# Altium footprint library Wurth_Elektronik_Electromechanic_Wire_to_Board_Connectors_rev16a.PCBLIB: 662 footprints (part 5 of 42)
Each footprint in its own frame and in the unit in brackets; x right, y up, seen from the top. Pads: shape width x height; smd on the part's side, far side on the other; paste and mask are expansions set on the pad; w line width, h text height; cw(c..) or ccw(c..) is an arc to the next point about the centre after c.
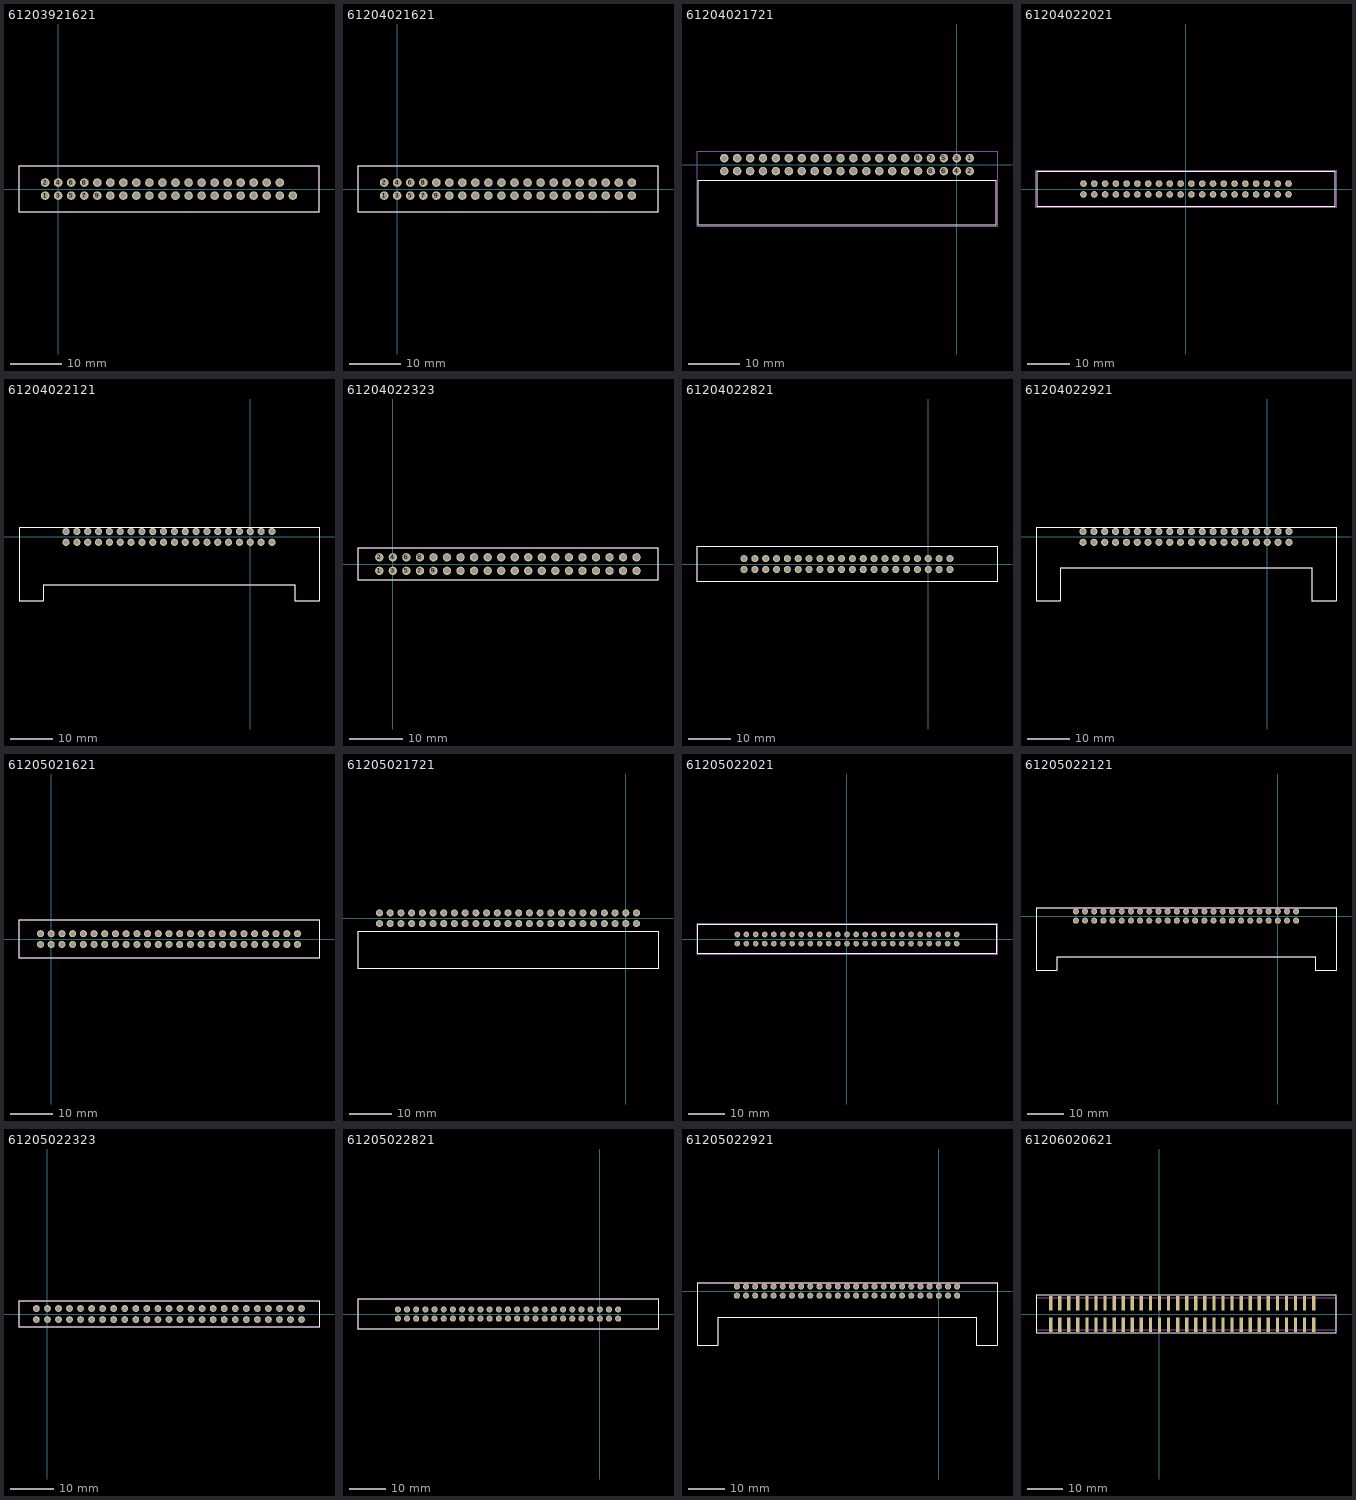
[diagram p4: the footprints below, top view; thin cyan lines are the x and y axes]

## 61203921621 [mil]
pads (39):
  round 66 hole 44: 1(-100,-50) 2(-100,50) 3(0,-50) 4(0,50) 5(100,-50) 6(100,50) 7(200,-50) 8(200,50) 9(300,-50) 10(300,50) 11(400,-50) 12(400,50) 13(500,-50) 14(500,50) 15(600,-50) 16(600,50) 17(700,-50) 18(700,50) 19(800,-50) 20(800,50) 21(900,-50) 22(900,50) 23(1000,-50) 24(1000,50) 25(1100,-50) 26(1100,50) 27(1200,-50) 28(1200,50) 29(1300,-50) 30(1300,50) 31(1400,-50) 32(1400,50) 33(1500,-50) 34(1500,50) 35(1600,-50) 36(1600,50) 37(1700,-50) 38(1700,50) 39(1800,-50)
Top Overlay:
  lines w5: -300.79,-179.13 2001,-179.13 2001,180 -300.79,180 -300.79,-179.13
Mechanical 2:
  text ">NAME" at 825,200 h77.5
Mechanical 4:
  text ">VALUE" at 800,-250 h77.5
Mechanical 16:
  lines w5: -300.79,-179.13 2001,-179.13 2001,180 -300.79,180 -300.79,-179.13
  text "1" at -125,-75 h77.5
  text "39" at 1757,-78.94 h77.5

## 61204021621 [mil]
pads (40):
  round 66 hole 44: 1(-100,-50) 2(-100,50) 3(0,-50) 4(0,50) 5(100,-50) 6(100,50) 7(200,-50) 8(200,50) 9(300,-50) 10(300,50) 11(400,-50) 12(400,50) 13(500,-50) 14(500,50) 15(600,-50) 16(600,50) 17(700,-50) 18(700,50) 19(800,-50) 20(800,50) 21(900,-50) 22(900,50) 23(1000,-50) 24(1000,50) 25(1100,-50) 26(1100,50) 27(1200,-50) 28(1200,50) 29(1300,-50) 30(1300,50) 31(1400,-50) 32(1400,50) 33(1500,-50) 34(1500,50) 35(1600,-50) 36(1600,50) 37(1700,-50) 38(1700,50) 39(1800,-50) 40(1800,50)
Top Overlay:
  lines w5: -300.79,-179.13 2001,-179.13 2001,180 -300.79,180 -300.79,-179.13
Mechanical 2:
  text ">NAME" at 825,200 h77.5
Mechanical 4:
  text ">VALUE" at 800,-250 h77.5
Mechanical 16:
  lines w5: -300.79,-179.13 2001,-179.13 2001,180 -300.79,180 -300.79,-179.13
  text "1" at -125,-75 h77.5
  text "40" at 1757,22 h77.5

## 61204021721 [mil]
pads (40):
  round 66 hole 44: 1(100,50) 2(100,-50) 3(0,50) 4(0,-50) 5(-100,50) 6(-100,-50) 7(-200,50) 8(-200,-50) 9(-300,50) 10(-300,-50) 11(-400,50) 12(-400,-50) 13(-500,50) 14(-500,-50) 15(-600,50) 16(-600,-50) 17(-700,50) 18(-700,-50) 19(-800,50) 20(-800,-50) 21(-900,50) 22(-900,-50) 23(-1000,50) 24(-1000,-50) 25(-1100,50) 26(-1100,-50) 27(-1200,50) 28(-1200,-50) 29(-1300,50) 30(-1300,-50) 31(-1400,50) 32(-1400,-50) 33(-1500,50) 34(-1500,-50) 35(-1600,50) 36(-1600,-50) 37(-1700,50) 38(-1700,-50) 39(-1800,50) 40(-1800,-50)
Top Overlay:
  lines w5: -2000.79,-470.87 301,-470.87 301,-122.44 -2000.79,-122.44 -2000.79,-470.87
Mechanical 2:
  text ">NAME" at 357,-250.7 h77.5
Mechanical 4:
  text ">VALUE" at 357,-348.7 h77.5
Mechanical 16:
  text "1" at 75,25 h77.5
  text "40" at -1850,-75 h77.5
  text "2" at 75,-75 h77.5
Mechanical 27:
  lines w5: -2010.63,-480.71 311,-480.71 311,103 -2010.63,103 -2010.63,-480.71

## 61204022021 [mil]
pads (40):
  round 61.5 hole 41: 1(950,50) 2(950,-50) 3(850,50) 4(850,-50) 5(750,50) 6(750,-50) 7(650,50) 8(650,-50) 9(550,50) 10(550,-50) 11(450,50) 12(450,-50) 13(350,50) 14(350,-50) 15(250,50) 16(250,-50) 17(150,50) 18(150,-50) 19(50,50) 20(50,-50) 21(-50,50) 22(-50,-50) 23(-150,50) 24(-150,-50) 25(-250,50) 26(-250,-50) 27(-350,50) 28(-350,-50) 29(-450,50) 30(-450,-50) 31(-550,50) 32(-550,-50) 33(-650,50) 34(-650,-50) 35(-750,50) 36(-750,-50) 37(-850,50) 38(-850,-50) 39(-950,50) 40(-950,-50)
Top Overlay:
  lines w5: -1379.92,-163.39 1380,-163.39 1380,164 -1379.92,164 -1379.92,-163.39
Mechanical 2:
  text ">NAME" at 0,200 h77.5
Mechanical 4:
  text ">VALUE" at 0,-250 h77.5
Mechanical 16:
  text "1" at 925,25 h77.5
  text "40" at -1000,-75 h77.5
  text "2" at 925,-75 h77.5
Mechanical 27:
  lines w5: -1389.76,-173.23 1390,-173.23 1390,174 -1389.76,174 -1389.76,-173.23

## 61204022121 [mil]
pads (40):
  round 66 hole 44: 1(200,50) 2(200,-50) 3(100,50) 4(100,-50) 5(0,50) 6(0,-50) 7(-100,50) 8(-100,-50) 9(-200,50) 10(-200,-50) 11(-300,50) 12(-300,-50) 13(-400,50) 14(-400,-50) 15(-500,50) 16(-500,-50) 17(-600,50) 18(-600,-50) 19(-700,50) 20(-700,-50) 21(-800,50) 22(-800,-50) 23(-900,50) 24(-900,-50) 25(-1000,50) 26(-1000,-50) 27(-1100,50) 28(-1100,-50) 29(-1200,50) 30(-1200,-50) 31(-1300,50) 32(-1300,-50) 33(-1400,50) 34(-1400,-50) 35(-1500,50) 36(-1500,-50) 37(-1600,50) 38(-1600,-50) 39(-1700,50) 40(-1700,-50)
Top Overlay:
  lines w5: -2133.86,-590.55 -2133.86,90 634,90 634,-590.55 410,-590.55 410,-440.94 -1909.45,-440.94 -1909.45,-590.55 -2133.86,-590.55
Mechanical 2:
  text ">NAME" at -875,125 h77.5
Mechanical 4:
  text ">VALUE" at -886.81,-639.57 h77.5
Mechanical 16:
  lines w5: -2133.86,-590.55 -1909.45,-590.55 -1909.45,-440.94 410,-440.94 410,-590.55 634,-590.55 634,90 -2133.86,90 -2133.86,-590.55
  text "1" at 175,25 h77.5
  text "40" at -1750,-75 h77.5

## 61204022323 [mil]
pads (40):
  round 61.5 hole 41: 1(-100,-50) 2(-100,50) 3(0,-50) 4(0,50) 5(100,-50) 6(100,50) 7(200,-50) 8(200,50) 9(300,-50) 10(300,50) 11(400,-50) 12(400,50) 13(500,-50) 14(500,50) 15(600,-50) 16(600,50) 17(700,-50) 18(700,50) 19(800,-50) 20(800,50) 21(900,-50) 22(900,50) 23(1000,-50) 24(1000,50) 25(1100,-50) 26(1100,50) 27(1200,-50) 28(1200,50) 29(1300,-50) 30(1300,50) 31(1400,-50) 32(1400,50) 33(1500,-50) 34(1500,50) 35(1600,-50) 36(1600,50) 37(1700,-50) 38(1700,50) 39(1800,-50) 40(1800,50)
Top Overlay:
  lines w5: -257.28,-118.11 1958,-118.11 1958,119 -257.28,119 -257.28,-118.11
Mechanical 2:
  text ">NAME" at 775,150 h77.5
Mechanical 4:
  text ">VALUE" at 775,-200 h77.5
Mechanical 16:
  lines w5: -257.28,-118.11 1958,-118.11 1958,119 -257.28,119 -257.28,-118.11
  text "1" at -125,-75 h77.5
  text "40" at 1750,25 h77.5

## 61204022821 [mil]
pads (40):
  round 66 hole 44: 1(200,50) 2(200,-50) 3(100,50) 4(100,-50) 5(0,50) 6(0,-50) 7(-100,50) 8(-100,-50) 9(-200,50) 10(-200,-50) 11(-300,50) 12(-300,-50) 13(-400,50) 14(-400,-50) 15(-500,50) 16(-500,-50) 17(-600,50) 18(-600,-50) 19(-700,50) 20(-700,-50) 21(-800,50) 22(-800,-50) 23(-900,50) 24(-900,-50) 25(-1000,50) 26(-1000,-50) 27(-1100,50) 28(-1100,-50) 29(-1200,50) 30(-1200,-50) 31(-1300,50) 32(-1300,-50) 33(-1400,50) 34(-1400,-50) 35(-1500,50) 36(-1500,-50) 37(-1600,50) 38(-1600,-50) 39(-1700,50) 40(-1700,-50)
Top Overlay:
  lines w5: -2133.86,-163.39 634,-163.39 634,164 -2133.86,164 -2133.86,-163.39
Mechanical 2:
  text ">NAME" at -750,200 h77.5
Mechanical 4:
  text ">VALUE" at -750,-250 h77.5
Mechanical 16:
  lines w5: -2133.86,-163.39 634,-163.39 634,164 -2133.86,164 -2133.86,-163.39
  text "1" at 175,25 h77.5
  text "40" at -1750,-75 h77.5

## 61204022921 [mil]
pads (40):
  round 66 hole 44: 1(200,50) 2(200,-50) 3(100,50) 4(100,-50) 5(0,50) 6(0,-50) 7(-100,50) 8(-100,-50) 9(-200,50) 10(-200,-50) 11(-300,50) 12(-300,-50) 13(-400,50) 14(-400,-50) 15(-500,50) 16(-500,-50) 17(-600,50) 18(-600,-50) 19(-700,50) 20(-700,-50) 21(-800,50) 22(-800,-50) 23(-900,50) 24(-900,-50) 25(-1000,50) 26(-1000,-50) 27(-1100,50) 28(-1100,-50) 29(-1200,50) 30(-1200,-50) 31(-1300,50) 32(-1300,-50) 33(-1400,50) 34(-1400,-50) 35(-1500,50) 36(-1500,-50) 37(-1600,50) 38(-1600,-50) 39(-1700,50) 40(-1700,-50)
Top Overlay:
  lines w5: -2133.86,-590.16 -2133.86,90 634,90 634,-590.16 410,-590.16 410,-283.46 -1909.45,-283.46 -1909.45,-590.16 -2133.86,-590.16
Mechanical 2:
  text ">NAME" at -875,125 h77.5
Mechanical 4:
  text ">VALUE" at -886.81,-482.09 h77.5
Mechanical 16:
  lines w5: -2133.86,-590.16 -1909.45,-590.16 -1909.45,-283.46 410,-283.46 410,-590.16 634,-590.16 634,90 -2133.86,90 -2133.86,-590.16
  text "1" at 175,25 h77.5
  text "40" at -1750,-75 h77.5

## 61205021621 [mil]
pads (50):
  round 66 hole 44: 1(-100,-50) 2(-100,50) 3(0,-50) 4(0,50) 5(100,-50) 6(100,50) 7(200,-50) 8(200,50) 9(300,-50) 10(300,50) 11(400,-50) 12(400,50) 13(500,-50) 14(500,50) 15(600,-50) 16(600,50) 17(700,-50) 18(700,50) 19(800,-50) 20(800,50) 21(900,-50) 22(900,50) 23(1000,-50) 24(1000,50) 25(1100,-50) 26(1100,50) 27(1200,-50) 28(1200,50) 29(1300,-50) 30(1300,50) 31(1400,-50) 32(1400,50) 33(1500,-50) 34(1500,50) 35(1600,-50) 36(1600,50) 37(1700,-50) 38(1700,50) 39(1800,-50) 40(1800,50) 41(1900,-50) 42(1900,50) 43(2000,-50) 44(2000,50) 45(2100,-50) 46(2100,50) 47(2200,-50) 48(2200,50) 49(2300,-50) 50(2300,50)
Top Overlay:
  lines w5: -300.79,-179.13 2501,-179.13 2501,180 -300.79,180 -300.79,-179.13
Mechanical 2:
  text ">NAME" at 1025,200 h77.5
Mechanical 4:
  text ">VALUE" at 1000,-250 h77.5
Mechanical 16:
  lines w5: -300.79,-179.13 2501,-179.13 2501,180 -300.79,180 -300.79,-179.13
  text "1" at -125,-75 h77.5
  text "50" at 2257,22 h77.5

## 61205021721 [mil]
pads (50):
  round 66 hole 44: 1(100,50) 2(100,-50) 3(0,50) 4(0,-50) 5(-100,50) 6(-100,-50) 7(-200,50) 8(-200,-50) 9(-300,50) 10(-300,-50) 11(-400,50) 12(-400,-50) 13(-500,50) 14(-500,-50) 15(-600,50) 16(-600,-50) 17(-700,50) 18(-700,-50) 19(-800,50) 20(-800,-50) 21(-900,50) 22(-900,-50) 23(-1000,50) 24(-1000,-50) 25(-1100,50) 26(-1100,-50) 27(-1200,50) 28(-1200,-50) 29(-1300,50) 30(-1300,-50) 31(-1400,50) 32(-1400,-50) 33(-1500,50) 34(-1500,-50) 35(-1600,50) 36(-1600,-50) 37(-1700,50) 38(-1700,-50) 39(-1800,50) 40(-1800,-50) 41(-1900,50) 42(-1900,-50) 43(-2000,50) 44(-2000,-50) 45(-2100,50) 46(-2100,-50) 47(-2200,50) 48(-2200,-50) 49(-2300,50) 50(-2300,-50)
Top Overlay:
  lines w5: -2500.79,-470.87 301,-470.87 301,-122.44 -2500.79,-122.44 -2500.79,-470.87
Mechanical 2:
  text ">NAME" at 357,-250.7 h77.5
Mechanical 4:
  text ">VALUE" at 357,-348.7 h77.5
Mechanical 16:
  lines w5: -2500.79,-470.87 301,-470.87 301,-122.44 -2500.79,-122.44 -2500.79,-470.87
  text "1" at 75,25 h77.5
  text "50" at -2325,-75 h77.5

## 61205022021 [mil]
pads (50):
  round 61.5 hole 41: 1(1200,50) 2(1200,-50) 3(1100,50) 4(1100,-50) 5(1000,50) 6(1000,-50) 7(900,50) 8(900,-50) 9(800,50) 10(800,-50) 11(700,50) 12(700,-50) 13(600,50) 14(600,-50) 15(500,50) 16(500,-50) 17(400,50) 18(400,-50) 19(300,50) 20(300,-50) 21(200,50) 22(200,-50) 23(100,50) 24(100,-50) 25(0,50) 26(0,-50) 27(-100,50) 28(-100,-50) 29(-200,50) 30(-200,-50) 31(-300,50) 32(-300,-50) 33(-400,50) 34(-400,-50) 35(-500,50) 36(-500,-50) 37(-600,50) 38(-600,-50) 39(-700,50) 40(-700,-50) 41(-800,50) 42(-800,-50) 43(-900,50) 44(-900,-50) 45(-1000,50) 46(-1000,-50) 47(-1100,50) 48(-1100,-50) 49(-1200,50) 50(-1200,-50)
Top Overlay:
  lines w5: -1630.91,-163.39 1631,-163.39 1631,164 -1630.91,164 -1630.91,-163.39
Mechanical 2:
  text ">NAME" at -200,200 h77.5
Mechanical 4:
  text ">VALUE" at -200,-250 h77.5
Mechanical 16:
  text "1" at 1175,25 h77.5
  text "50" at -1250,-75 h77.5
  text "2" at 1175,-75 h77.5
Mechanical 27:
  lines w5: -1640.75,-173.23 1641,-173.23 1641,174 -1640.75,174 -1640.75,-173.23

## 61205022121 [mil]
pads (50):
  round 66 hole 44: 1(200,50) 2(200,-50) 3(100,50) 4(100,-50) 5(0,50) 6(0,-50) 7(-100,50) 8(-100,-50) 9(-200,50) 10(-200,-50) 11(-300,50) 12(-300,-50) 13(-400,50) 14(-400,-50) 15(-500,50) 16(-500,-50) 17(-600,50) 18(-600,-50) 19(-700,50) 20(-700,-50) 21(-800,50) 22(-800,-50) 23(-900,50) 24(-900,-50) 25(-1000,50) 26(-1000,-50) 27(-1100,50) 28(-1100,-50) 29(-1200,50) 30(-1200,-50) 31(-1300,50) 32(-1300,-50) 33(-1400,50) 34(-1400,-50) 35(-1500,50) 36(-1500,-50) 37(-1600,50) 38(-1600,-50) 39(-1700,50) 40(-1700,-50) 41(-1800,50) 42(-1800,-50) 43(-1900,50) 44(-1900,-50) 45(-2000,50) 46(-2000,-50) 47(-2100,50) 48(-2100,-50) 49(-2200,50) 50(-2200,-50)
Top Overlay:
  lines w5: -2633.86,-590.55 -2633.86,90 634,90 634,-590.55 410,-590.55 410,-440.94 -2409.45,-440.94 -2409.45,-590.55 -2633.86,-590.55
Mechanical 2:
  text ">NAME" at -1200,125 h77.5
Mechanical 4:
  text ">VALUE" at -1211.81,-614.57 h77.5
Mechanical 16:
  lines w5: -2633.86,-590.55 -2409.45,-590.55 -2409.45,-440.94 410,-440.94 410,-590.55 634,-590.55 634,90 -2633.86,90 -2633.86,-590.55
  text "1" at 175,25 h77.5
  text "50" at -2250,-75 h77.5

## 61205022323 [mil]
pads (50):
  round 61.5 hole 41: 1(-100,-50) 2(-100,50) 3(0,-50) 4(0,50) 5(100,-50) 6(100,50) 7(200,-50) 8(200,50) 9(300,-50) 10(300,50) 11(400,-50) 12(400,50) 13(500,-50) 14(500,50) 15(600,-50) 16(600,50) 17(700,-50) 18(700,50) 19(800,-50) 20(800,50) 21(900,-50) 22(900,50) 23(1000,-50) 24(1000,50) 25(1100,-50) 26(1100,50) 27(1200,-50) 28(1200,50) 29(1300,-50) 30(1300,50) 31(1400,-50) 32(1400,50) 33(1500,-50) 34(1500,50) 35(1600,-50) 36(1600,50) 37(1700,-50) 38(1700,50) 39(1800,-50) 40(1800,50) 41(1900,-50) 42(1900,50) 43(2000,-50) 44(2000,50) 45(2100,-50) 46(2100,50) 47(2200,-50) 48(2200,50) 49(2300,-50) 50(2300,50)
Top Overlay:
  lines w5: -257.28,-118.11 2458,-118.11 2458,119 -257.28,119 -257.28,-118.11
Mechanical 2:
  text ">NAME" at 1075,150 h77.5
Mechanical 4:
  text ">VALUE" at 1050,-200 h77.5
Mechanical 16:
  lines w5: -257.28,-118.11 2458,-118.11 2458,119 -257.28,119 -257.28,-118.11
  text "1" at -125,-75 h77.5
  text "50" at 2275,25 h77.5

## 61205022821 [mil]
pads (50):
  round 66 hole 44: 1(200,50) 2(200,-50) 3(100,50) 4(100,-50) 5(0,50) 6(0,-50) 7(-100,50) 8(-100,-50) 9(-200,50) 10(-200,-50) 11(-300,50) 12(-300,-50) 13(-400,50) 14(-400,-50) 15(-500,50) 16(-500,-50) 17(-600,50) 18(-600,-50) 19(-700,50) 20(-700,-50) 21(-800,50) 22(-800,-50) 23(-900,50) 24(-900,-50) 25(-1000,50) 26(-1000,-50) 27(-1100,50) 28(-1100,-50) 29(-1200,50) 30(-1200,-50) 31(-1300,50) 32(-1300,-50) 33(-1400,50) 34(-1400,-50) 35(-1500,50) 36(-1500,-50) 37(-1600,50) 38(-1600,-50) 39(-1700,50) 40(-1700,-50) 41(-1800,50) 42(-1800,-50) 43(-1900,50) 44(-1900,-50) 45(-2000,50) 46(-2000,-50) 47(-2100,50) 48(-2100,-50) 49(-2200,50) 50(-2200,-50)
Top Overlay:
  lines w5: -2633.86,-163.39 634,-163.39 634,164 -2633.86,164 -2633.86,-163.39
Mechanical 2:
  text ">NAME" at -1200,200 h77.5
Mechanical 4:
  text ">VALUE" at -1200,-250 h77.5
Mechanical 16:
  lines w5: -2633.86,-163.39 634,-163.39 634,164 -2633.86,164 -2633.86,-163.39
  text "1" at 175,25 h77.5
  text "50" at -2250,-75 h77.5

## 61205022921 [mil]
pads (50):
  round 66 hole 44: 1(200,50) 2(200,-50) 3(100,50) 4(100,-50) 5(0,50) 6(0,-50) 7(-100,50) 8(-100,-50) 9(-200,50) 10(-200,-50) 11(-300,50) 12(-300,-50) 13(-400,50) 14(-400,-50) 15(-500,50) 16(-500,-50) 17(-600,50) 18(-600,-50) 19(-700,50) 20(-700,-50) 21(-800,50) 22(-800,-50) 23(-900,50) 24(-900,-50) 25(-1000,50) 26(-1000,-50) 27(-1100,50) 28(-1100,-50) 29(-1200,50) 30(-1200,-50) 31(-1300,50) 32(-1300,-50) 33(-1400,50) 34(-1400,-50) 35(-1500,50) 36(-1500,-50) 37(-1600,50) 38(-1600,-50) 39(-1700,50) 40(-1700,-50) 41(-1800,50) 42(-1800,-50) 43(-1900,50) 44(-1900,-50) 45(-2000,50) 46(-2000,-50) 47(-2100,50) 48(-2100,-50) 49(-2200,50) 50(-2200,-50)
Top Overlay:
  lines w5: -2633.86,-590.16 -2633.86,90 634,90 634,-590.16 410,-590.16 410,-283.46 -2409.45,-283.46 -2409.45,-590.16 -2633.86,-590.16
Mechanical 2:
  text ">NAME" at -1200,125 h77.5
Mechanical 4:
  text ">VALUE" at -1211.81,-457.09 h77.5
Mechanical 16:
  lines w5: -2633.86,-590.16 -2409.45,-590.16 -2409.45,-283.46 410,-283.46 410,-590.16 634,-590.16 634,90 -2633.86,90 -2633.86,-590.16
  text "1" at 175,25 h77.5
  text "50" at -2250,-75 h77.5

## 61206020621 [mil]
pads (60):
  rect 36x158 smd: 1(-1200,-118.11) 2(-1200,119) 3(-1100,-118.11) 4(-1100,119) 5(-1000,-118.11) 6(-1000,119) 7(-900,-118.11) 8(-900,119) 9(-800,-118.11) 10(-800,119) 11(-700,-118.11) 12(-700,119) 13(-600,-118.11) 14(-600,119) 15(-500,-118.11) 16(-500,119) 17(-400,-118.11) 18(-400,119) 19(-300,-118.11) 20(-300,119) 21(-200,-118.11) 22(-200,119) 23(-100,-118.11) 24(-100,119) 25(0,-118.11) 26(0,119) 27(100,-118.11) 28(100,119) 29(200,-118.11) 30(200,119) 31(300,-118.11) 32(300,119) 33(400,-118.11) 34(400,119) 35(500,-118.11) 36(500,119) 37(600,-118.11) 38(600,119) 39(700,-118.11) 40(700,119) 41(800,-118.11) 42(800,119) 43(900,-118.11) 44(900,119) 45(1000,-118.11) 46(1000,119) 47(1100,-118.11) 48(1100,119) 49(1200,-118.11) 50(1200,119) 51(1300,-118.11) 52(1300,119) 53(1400,-118.11) 54(1400,119) 55(1500,-118.11) 56(1500,119) 57(1600,-118.11) 58(1600,119) 59(1700,-118.11) 60(1700,119)
Top Overlay:
  lines w5: -1361.42,-208.66 1946,-208.66 1946,209 -1361.42,209 -1361.42,-208.66
Mechanical 2:
  text ">NAME" at 275,250 h77.5
Mechanical 4:
  text ">VALUE" at 300,-300 h77.5
Mechanical 16:
  lines w5: -1361.42,-173.23 -1361.42,174 1946,174 1946,-173.23 -1361.42,-173.23
  text "1" at -1225,-125 h77.5
  text "60" at 1650,75 h77.5